# Altium footprint library Flight_controller v1.0.PcbLib: 98 footprints (part 1 of 7)
Each footprint in its own frame and in the unit in brackets; x right, y up, seen from the top. Pads: shape width x height; smd on the part's side, far side on the other; paste and mask are expansions set on the pad; w line width, h text height; cw(c..) or ccw(c..) is an arc to the next point about the centre after c.
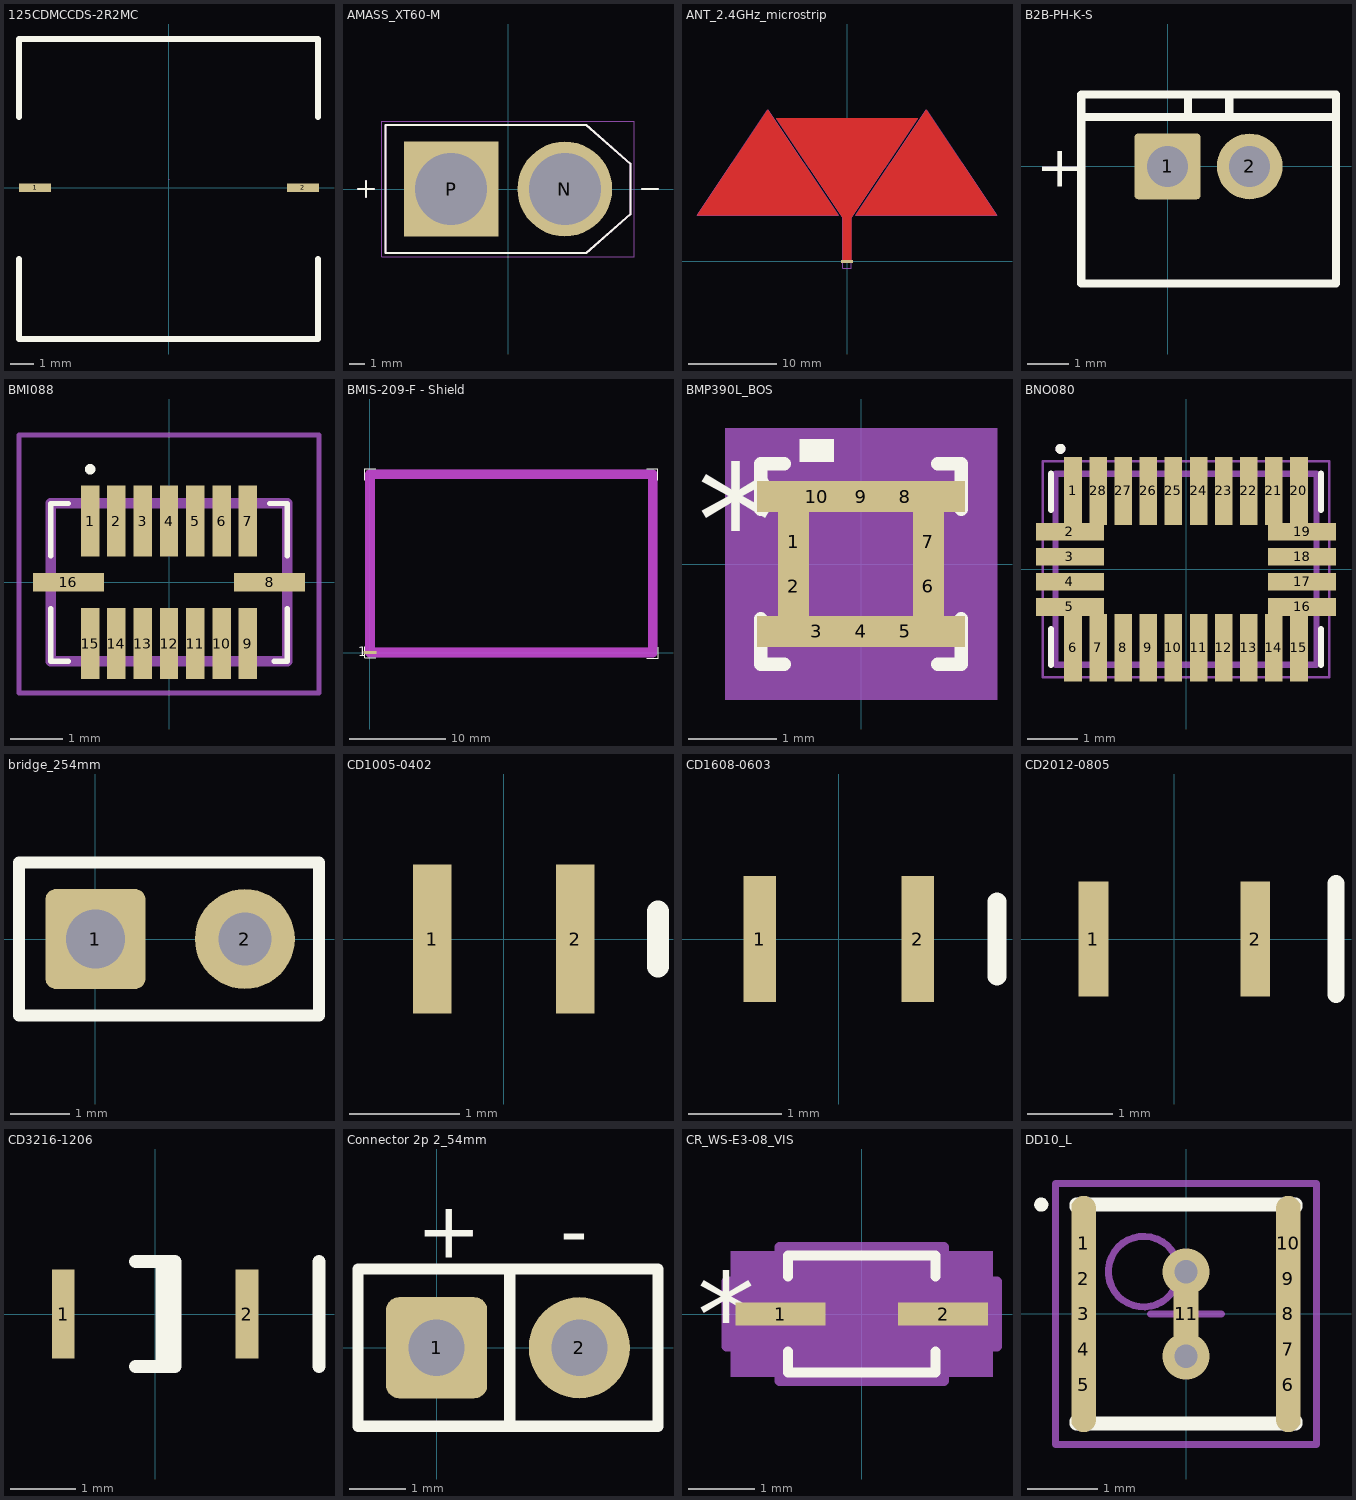
[diagram p0: the footprints below, top view; thin cyan lines are the x and y axes]

## 125CDMCCDS-2R2MC [mm] "20A 2.2uH 3.5mOhm"
pads (2):
  rect 1.35x0.35 smd paste+0.05 mask+0.05: 1(-5.625,0) 2(5.625,0)
Top Overlay:
  lines w0.254: -6.3,-2.981 -6.3,-6.35 6.25,-6.35 6.25,-2.981 ; -6.3,2.981 -6.3,6.25 6.25,6.25 6.25,2.981
Mechanical 15:
  lines w0.003: 0,0.349 0,0.35
3D body "OBJ_NEW_PCB.stp": height 32.93, standoff 0, extent 4021.177,-3068.845 4078.264,-3012.505
3D body "OBJ_NEW_PCB.stp": height 32.93, standoff 0, extent 4021.369,-3075.496 4078.456,-3019.156
3D body "OBJ_NEW_PCB_1.stp": height 32.93, standoff 0, extent 4022.066,-3066.051 4079.153,-3009.711

## AMASS_XT60-M [mm]
height 16
pads (2):
  round 6 hole 4.55: N(3.6,0)
  rect 6x6 / inner round 6 / far side rect 6x6 hole 4.55: P(-3.6,0)
Top Overlay:
  lines w0.127: -9.5,0 -8.5,0 ; -9,-0.5 -9,0.5 ; 8.5,0 9.5,0 ; -7.75,-4.05 -7.75,4.05 4.95,4.05 7.75,1.6 7.75,-1.6 4.95,-4.05 -7.75,-4.05
Mechanical 13:
  lines w0.127: -9.5,0 -8.5,0 ; -9,-0.5 -9,0.5 ; 8.5,0 9.5,0 ; -7.75,-4.05 -7.75,4.05 4.95,4.05 7.75,1.6 7.75,-1.6 4.95,-4.05 -7.75,-4.05
Mechanical 15:
  lines w0.05: -8,-4.3 8,-4.3 8,4.3 -8,4.3 -8,-4.3
3D body "step_temp.STEP": height 17.5, standoff -3, extent -7.75,-4.05 7.75,4.05

## ANT_2.4GHz_microstrip [mm] "Antenna 2.4 GHz ISM band - Microstrip"
height 0.2
pads (1):
  rect 1.35x0.35 smd paste+0.05 mask+0.05: 1(0,0)
Top Layer:
  region: 8,16.2 -8,16.2 -0.5,4.95 -0.5,0.2 0.5,0.2 0.5,4.95
  region: 1,5.2 17,5.2 9,17.2
  region: -17,5.2 -1,5.2 -9,17.2
Mechanical 15:
  lines w0.1: -0.5,-0.8 -0.5,4.95 -8,16.2 8,16.2 0.5,4.95 0.5,-0.8 ; -0.5,-0.8 -0.5,0.15 0.5,0.15 0.5,-0.8 ; -0.5,-0.8 0.5,-0.8 ; -17,5.2 -1,5.2 -9,17.2 -17,5.2 ; 1,5.2 9,17.2 17,5.2 1,5.2
3D body: height 2.95, standoff 0, extent -0.5,-0.25 0.5,0.2

## B2B-PH-K-S [mm] "B2B-PH-K-S; JST; Battery Connector; Header; 2 Position"
pads (2):
  rrect10% 1.6x1.6 hole 1: 1(0,0)
  round 1.6 hole 1: 2(2,0)
Top Overlay:
  lines w0.2: -2.1,1.2 4.1,1.2 ; 0.5,1.2 0.5,1.75 ; 1.5,1.2 1.5,1.75 ; -2.1,-2.85 -2.1,1.75 4.1,1.75 4.1,-2.85 -2.1,-2.85
  text "+" at -3.2,-0.5 h1
3D body: height 2.95, standoff 0, extent -2.1,-2.8 4.1,1.7

## BMI088 [mm]
pads (16):
  rect 0.35x1.35 smd paste+0.05 mask+0.05: 1(-1.5,1.165) 2(-1,1.165) 3(-0.5,1.165) 4(0,1.165) 5(0.5,1.165) 6(1,1.165) 7(1.5,1.165) 9(1.5,-1.165) 10(1,-1.165) 11(0.5,-1.165) 12(0,-1.165) 13(-0.5,-1.165) 14(-1,-1.165) 15(-1.5,-1.165)
  rect 1.35x0.35 smd paste+0.05 mask+0.05: 8(1.915,0) 16(-1.915,0)
Top Overlay:
  lines w0.1: -2.25,-0.5 -2.25,-1.5 -1.915,-1.5 ; -2.25,0.5 -2.25,1.5 -1.915,1.5 ; 1.915,1.5 2.25,1.5 2.25,0.5 ; 2,-1.5 2.25,-1.5 2.25,-0.5 ; -1.5,2.1 cw(c-1.5,2.15) -1.5,2.2 cw(c-1.5,2.15) -1.5,2.1
Mechanical 13:
  lines w0.2: -2.25,-1.5 2.25,-1.5 2.25,1.5 -2.25,1.5 -2.25,-1.5
Mechanical 15:
  lines w0.1: -2.852,-2.103 2.852,-2.103 2.852,2.8 -2.852,2.8 -2.852,-2.103
3D body "BMI088.stp": height 1.55, standoff 0, extent -2.25,-1.5 2.25,1.5

## BMIS-209-F - Shield [mm] "BMIS-209-F EMI Gasket - modif SolderMask - Standard Surface Mount Shields -  Laird Technologies"
height 6.5
pads (1):
  rect 1.35x0.35 smd paste+0.05 mask+0.05: 1(0,0)
Top Overlay:
  lines w0.1: -0.55,0.6 -0.55,-0.55 0.6,-0.55 ; -0.55,18 -0.55,19.15 0.6,19.15 ; 28.9,-0.6 30.05,-0.6 30.05,0.55 ; 28.9,19.15 30.05,19.15 30.05,18
  text "1" at -1.25,-0.4 h1
Top Paste:
  region: 4.35,19 4.35,18 -0.4,18 -0.4,19
  region: 7.1,19 10.3,19 10.3,18 7.1,18
  region: 13.1,19 16.35,19 16.35,18 13.1,18
  region: 19.1,19 22.3,19 22.3,18 19.1,18
  region: 25.1,19 29.9,19 29.9,18 25.1,18
  region: 28.9,4.85 29.9,4.85 29.9,-0.45 28.9,-0.45
  region: 28.9,10.85 29.9,10.85 29.9,7.65 28.9,7.65
  region: 28.9,13.65 28.9,18.95 29.9,18.95 29.9,13.65
  region: -0.4,13.7 -0.4,19 0.6,19 0.6,13.7
  region: -0.4,10.9 0.6,10.9 0.6,7.7 -0.4,7.7
  region: -0.4,4.6 0.6,4.6 0.6,-0.4 -0.4,-0.4
  region: 25.1,0.55 29.9,0.55 29.9,-0.45 25.1,-0.45
  region: 19.1,0.6 22.3,0.6 22.3,-0.4 19.1,-0.4
  region: 13.1,0.6 16.35,0.6 16.35,-0.4 13.1,-0.4
  region: 7.1,0.375 10.3,0.375 10.3,-0.4 7.1,-0.4
  region: 4.35,0.6 4.35,-0.4 -0.4,-0.4 -0.4,0.6
Top Solder:
  region: 28.9,13.65 28.9,18.95 29.9,18.95 29.9,13.65
  region: 28.9,7.65 28.9,10.85 29.9,10.85 29.9,7.65
  region: 28.9,-0.45 28.9,4.85 29.9,4.85 29.9,-0.45
  region: -0.4,-0.4 -0.4,4.6 0.6,4.6 0.6,-0.4
  region: -0.4,7.7 -0.4,10.9 0.6,10.9 0.6,7.7
  region: -0.4,13.7 -0.4,19 0.6,19 0.6,13.7
  region: 4.35,-0.4 -0.4,-0.4 -0.4,0.6 4.35,0.6
  region: 10.3,-0.4 7.1,-0.4 7.1,0.375 10.3,0.375
  region: 16.35,-0.4 13.1,-0.4 13.1,0.6 16.35,0.6
  region: 29.9,-0.45 25.1,-0.45 25.1,0.55 29.9,0.55
  region: 22.3,-0.4 19.1,-0.4 19.1,0.6 22.3,0.6
  region: 22.3,18 19.1,18 19.1,19 22.3,19
  region: 29.9,18 25.1,18 25.1,19 29.9,19
  region: 16.35,18 13.1,18 13.1,19 16.35,19
  region: 10.3,18 7.1,18 7.1,19 10.3,19
  region: 4.35,18 -0.4,18 -0.4,19 4.35,19
Mechanical 15 keep-out:
  lines w1: 0,0 29.5,0 29.5,18.6 0,18.6 0,0
3D body: height 0.8, standoff 0.2, extent -0.3,-0.3 0.3,0.3

## BMP390L_BOS [mm]
pads (10):
  rect 0.35x1.35 smd paste+0.05 mask+0.05: 1(-0.76,0.25) 2(-0.76,-0.25) 6(0.76,-0.25) 7(0.76,0.25)
  rect 1.35x0.35 smd paste+0.05 mask+0.05: 3(-0.5,-0.76) 4(0,-0.76) 5(0.5,-0.76) 8(0.5,0.76) 9(0,0.76) 10(-0.5,0.76)
Top Overlay:
  region: -0.309,1.154 -0.69,1.154 -0.69,1.408 -0.309,1.408
  lines w0.152: -1.13,-0.617 -1.13,-1.13 -0.867,-1.13 ; -1.13,0.617 -1.13,1.13 -0.867,1.13 ; 0.867,-1.13 1.13,-1.13 1.13,-0.617 ; 0.867,1.13 1.13,1.13 1.13,0.617
  text "*" at -1.853,-0.135 h1.27
Mechanical 5:
  region: 1.535,-1.535 -1.535,-1.535 -1.535,1.535 1.535,1.535
Mechanical 13:
  lines w0.025: -1.003,-0.267 0.267,1.003 ; -1.003,-1.003 1.003,-1.003 1.003,1.003 -1.003,1.003 -1.003,-1.003 ; -1.003,-0.377 -1.003,-0.123 -0.9,-0.123 -0.9,-0.377 -1.003,-0.377 ; -1.003,0.123 -1.003,0.377 -0.9,0.377 -0.9,0.123 -1.003,0.123 ; -0.627,-1.003 -0.373,-1.003 -0.373,-0.9 -0.627,-0.9 -0.627,-1.003 ; -0.627,0.9 -0.373,0.9 -0.373,1.003 -0.627,1.003 -0.627,0.9 ; -0.127,-1.003 0.127,-1.003 0.127,-0.9 -0.127,-0.9 -0.127,-1.003 ; -0.127,0.9 0.127,0.9 0.127,1.003 -0.127,1.003 -0.127,0.9 ; 0.373,-1.003 0.627,-1.003 0.627,-0.9 0.373,-0.9 0.373,-1.003 ; 0.373,0.9 0.627,0.9 0.627,1.003 0.373,1.003 0.373,0.9 ; 0.9,-0.377 1.003,-0.377 1.003,-0.123 0.9,-0.123 0.9,-0.377 ; 0.9,0.123 1.003,0.123 1.003,0.377 0.9,0.377 0.9,0.123
  text "*" at -0.938,-0.135 h1.27
Mechanical 15:
  region: -0.881,-1.257 -1.257,-1.257 -1.257,-0.631 -1.257,0.631 -1.257,1.257 -0.881,1.257 0.881,1.257 1.257,1.257 1.257,0.631 1.257,-0.631 1.257,-1.257 0.881,-1.257
  lines w0.152: -1.257,-1.257 -1.257,-0.631 -1.257,0.631 -1.257,1.257 -0.881,1.257 0.881,1.257 1.257,1.257 1.257,0.631 1.257,-0.631 1.257,-1.257 0.881,-1.257 -0.881,-1.257 -1.257,-1.257
3D body "BMP390L_BOS.step": height 1.65, standoff 0, extent -1.003,-1.003 1.003,1.003

## BNO080 [mm]
pads (28):
  rect 0.35x1.35 smd paste+0.05 mask+0.05: 1(-2.25,1.562) 6(-2.25,-1.562) 7(-1.75,-1.562) 8(-1.25,-1.562) 9(-0.75,-1.562) 10(-0.25,-1.562) 11(0.25,-1.562) 12(0.75,-1.562) 13(1.25,-1.562) 14(1.75,-1.562) 15(2.25,-1.562) 20(2.25,1.562) 21(1.75,1.562) 22(1.25,1.562) 23(0.75,1.562) 24(0.25,1.562) 25(-0.25,1.562) 26(-0.75,1.562) 27(-1.25,1.562) 28(-1.75,1.562)
  rect 1.35x0.35 smd paste+0.05 mask+0.05: 2(-2.312,0.75) 3(-2.312,0.25) 4(-2.312,-0.25) 5(-2.312,-0.75) 16(2.312,-0.75) 17(2.312,-0.25) 18(2.312,0.25) 19(2.312,0.75)
Top Overlay:
  circle w0.1: c-2.5,2.4 r0.05
  lines w0.127: -2.689,-1.9 -2.689,-1.188 ; -2.689,1.188 -2.689,1.9 ; 2.689,-1.9 2.689,-1.188 ; 2.689,1.188 2.689,1.9
Mechanical 13:
  circle w0.1: c-2.5,2.4 r0.05
  lines w0.127: -2.6,-1.9 -2.6,1.9 2.6,1.9 2.6,-1.9 -2.6,-1.9
Mechanical 15:
  lines w0.05: -2.85,-2.15 -2.85,2.15 2.85,2.15 2.85,-2.15 -2.85,-2.15

## bridge_254mm [mm] "Generic Bridge 2.54mm, 2 Leads 0.9mm;"
height 1
pads (2):
  rrect20% 1.7x1.7 hole 1 paste+0 mask+0.05: 1(0,0)
  round 1.7 hole 0.9 paste+0 mask+0.05: 2(2.54,0)
Top Overlay:
  lines w0.2: -1.3,-1.3 3.8,-1.3 3.8,1.3 -1.3,1.3 -1.3,-1.3

## CD1005-0402 [mm] "Chip Diode; Body 1.0 x 0.5 mm (LxW typ)"
height 0.6
pads (2):
  rect 0.35x1.35 smd paste+0.05 mask+0.05: 1(-0.65,0) 2(0.65,0)
Top Overlay:
  lines w0.2: 1.4,-0.25 1.4,0.25

## CD1608-0603 [mm] "Chip Diode; Body 1.6 x 0.8 mm (LxW typ)"
height 0.85
pads (2):
  rect 0.35x1.35 smd paste+0.05 mask+0.05: 1(-0.85,0) 2(0.85,0)
Top Overlay:
  lines w0.2: 1.7,-0.4 1.7,0.4

## CD2012-0805 [mm] "Chip Diode; Body 2.0 x 1.3 mm (LxW typ)"
height 1.1
pads (2):
  rect 0.35x1.35 smd paste+0.05 mask+0.05: 1(-0.95,0) 2(0.95,0)
Top Overlay:
  lines w0.2: 1.9,-0.65 1.9,0.65

## CD3216-1206 [mm] "Chip Diode; Body 3.2 x 1.6 mm (LxW typ)"
height 1.35
pads (2):
  rect 0.35x1.35 smd paste+0.05 mask+0.05: 1(-1.4,0) 2(1.4,0)
Top Overlay:
  lines w0.2: -0.3,-0.8 0.3,-0.8 0.3,0.8 -0.3,0.8 ; 0.11,-0.8 0.11,0.8 ; 2.5,-0.8 2.5,0.8

## Connector 2p 2_54mm [mm] "Generic connector 2.54mm, 2 Leads 1mm;"
height 1
pads (2):
  rrect25% 1.8x1.8 hole 1 paste+0 mask+0.05: 1(0,0)
  round 1.8 hole 1 paste+0 mask+0.05: 2(2.54,0)
Top Overlay:
  lines w0.2: 1.3,-1.4 1.3,1.4 ; -1.4,-1.4 3.94,-1.4 3.94,1.4 -1.4,1.4 -1.4,-1.4
  text "+" at -0.35,1.6 h1
  text "-" at 2.2,1.6 h1

## CR_WS-E3-08_VIS [mm]
pads (2):
  rect 1.35x0.35 smd paste+0.05 mask+0.05: 1(-1.219,0) 2(1.219,0)
Top Overlay:
  lines w0.152: -1.105,-0.566 -1.105,-0.876 1.105,-0.876 1.105,-0.566 ; -1.105,0.566 -1.105,0.876 1.105,0.876 1.105,0.566
  text "*" at -2.471,-0.635 h1.27
Mechanical 5:
  region: 1.963,-0.94 -1.963,-0.94 -1.963,0.94 1.963,0.94
Mechanical 13:
  lines w0.025: -0.978,-0.375 -0.603,-0.749 ; -0.978,0.375 -0.603,0.749 ; -1.422,-0.203 -0.978,-0.203 -0.978,0.203 -1.422,0.203 -1.422,-0.203 ; -0.978,-0.749 -0.978,0.749 0.978,0.749 0.978,-0.749 -0.978,-0.749 ; 0.978,-0.203 1.422,-0.203 1.422,0.203 0.978,0.203 0.978,-0.203
  text "*" at -1.041,-0.635 h1.27
Mechanical 15:
  region: -1.232,-0.487 -2.026,-0.487 -2.026,0.487 -1.232,0.487 -1.232,1.003 1.232,1.003 1.232,0.487 2.026,0.487 2.026,-0.487 1.232,-0.487 1.232,-1.003 -1.232,-1.003
  lines w0.152: -2.026,-0.487 -1.232,-0.487 -1.232,-1.003 1.232,-1.003 1.232,-0.487 2.026,-0.487 2.026,0.487 1.232,0.487 1.232,1.003 -1.232,1.003 -1.232,0.487 -2.026,0.487 -2.026,-0.487
3D body "CR_WS-E3-08_VIS.step": height 1.15, standoff 0, extent -1.422,-0.749 1.422,0.749

## DD10_L [mm] "SON, 10-Leads, Body 3x3 mm, Pitch 0.5mm, IPC High Density"
height 0.8
pads (11):
  oval 0.35x1.35 smd paste+0.05 mask+0.05: 1(-1.45,1) 2(-1.45,0.5) 3(-1.45,0) 4(-1.45,-0.5) 5(-1.45,-1) 6(1.45,-1) 7(1.45,-0.5) 8(1.45,0) 9(1.45,0.5) 10(1.45,1)
  rect 0.35x1.35 smd paste+0.05 mask+0.05: 11(0,0)
via 0,0.6 diameter 0.66 hole 0.33
via 0,-0.6 diameter 0.66 hole 0.33
Top Overlay:
  circle w0.1: c-2.05,1.55 r0.05
  lines w0.2: -1.55,-1.525 -1.55,-1.55 1.55,-1.55 1.55,-1.525 ; -1.55,1.525 -1.55,1.55 1.55,1.55 1.55,1.525
Mechanical 13:
  circle w0.1: c-0.6,0.6 r0.5
  lines w0.1: -1.55,-1.55 1.55,-1.55 1.55,1.55 -1.55,1.55 -1.55,-1.55
Mechanical 15:
  lines w0.1: -0.5,0 0.5,0 ; 0,-0.5 0,0.5 ; -1.85,-1.85 1.85,-1.85 1.85,1.85 -1.85,1.85 -1.85,-1.85
3D body: height 0.8, standoff 0, extent -1.55,-1.55 1.55,1.55